# Altium integrated library Jesse_Library.IntLib: 1056 symbols (part 2 of 4) (continued)
## Ind 0804T 10uH 20% (continued)

## Ind 0805 1uH 10%
designator L?, comment 1uH ±10%
贴片电感; ComponentLink1Description: 供应商链接; ComponentLink1URL: http://www.szlcsc.com/product/details_1394.html; Package: 0805; Supplier: LC; SuppliersPartNumber: C1042
footprint 0805_L
pins: 1, 2

## Ind 0805 2.2uH 10%
designator L?, comment 2.2uH ±10%
贴片电感; ComponentLink1Description: 供应商链接; ComponentLink1URL: http://www.szlcsc.com/product/details_1395.html; Package: 0805; Supplier: LC; SuppliersPartNumber: C1043
footprint 0805_L
pins: 1, 2

## Ind 0805 3.3uH10%
designator L?, comment 3.3uH±10%
贴片电感; ComponentLink1Description: 供应商链接; ComponentLink1URL: http://www.szlcsc.com/product/details_52738.html; Package: 0805; Supplier: LC; SuppliersPartNumber: C51725
footprint 0805_L
pins: 1, 2

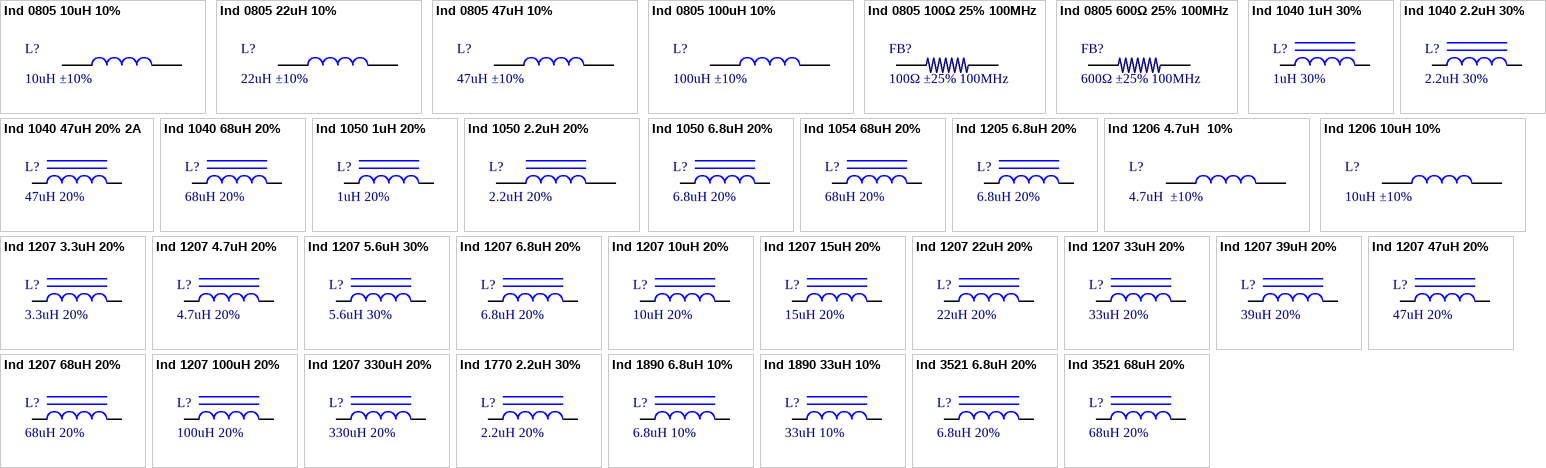
[diagram p20: symbols Ind 0805 10uH 10% to Ind 3521 68uH 20%]

## Ind 0805 10uH 10%
designator L?, comment 10uH ±10%
贴片电感; ComponentLink1Description: 供应商链接; ComponentLink1URL: http://www.szlcsc.com/product/details_1398.html; Package: 0805; Supplier: LC; SuppliersPartNumber: C1046
footprint 0805_L
pins: 1, 2

## Ind 0805 22uH 10%
designator L?, comment 22uH ±10%
贴片电感; ComponentLink1Description: 供应商链接; ComponentLink1URL: http://www.szlcsc.com/product/details_33340.html; Package: 0805; Supplier: LC; SuppliersPartNumber: C32375
footprint 0805_L
pins: 1, 2

## Ind 0805 47uH 10%
designator L?, comment 47uH ±10%
贴片电感; ComponentLink1Description: 供应商链接; ComponentLink1URL: http://www.szlcsc.com/product/details_14964.html; Package: 0805; Supplier: LC; SuppliersPartNumber: C14304
footprint 0805_L
pins: 1, 2

## Ind 0805 100uH 10%
designator L?, comment 100uH ±10%
贴片电感; ComponentLink1Description: 供应商链接; ComponentLink1URL: http://www.szlcsc.com/product/details_69137.html; Package: 0805; Supplier: LC; SuppliersPartNumber: C68035
footprint 0805_L
pins: 1, 2

## Ind 0805 100Ω 25% 100MHz
designator FB?, comment 100Ω ±25% 100MHz
贴片磁珠; ComponentLink1Description: 供应商链接; ComponentLink1URL: http://www.szlcsc.com/product/details_1367.html; Package: 0805; Supplier: LC; SuppliersPartNumber: C1015
footprint 0805_L
pins: 1, 2

## Ind 0805 600Ω 25% 100MHz
designator FB?, comment 600Ω ±25% 100MHz
贴片磁珠; ComponentLink1Description: 供应商链接; ComponentLink1URL: http://www.szlcsc.com/product/details_1369.html; Package: 0805; Supplier: LC; SuppliersPartNumber: C1017
footprint 0805_L
pins: 1, 2

## Ind 1040 1uH 30%
designator L?, comment 1uH 30%
贴片功率电感
footprint 1040_L
pins: 1, 2

## Ind 1040 2.2uH 30%
designator L?, comment 2.2uH 30%
贴片功率电感
footprint 1040_L
pins: 1, 2

## Ind 1040 47uH 20% 2A
designator L?, comment 47uH 20%
贴片功率电感
footprint 1040_L
pins: 1, 2

## Ind 1040 68uH 20%
designator L?, comment 68uH 20%
贴片功率电感
footprint 1040_L
pins: 1, 2

## Ind 1050 1uH 20%
designator L?, comment 1uH 20%
贴片功率电感
footprint 1050_L
pins: 1, 2

## Ind 1050 2.2uH 20%
designator L?, comment 2.2uH 20%
贴片功率电感
footprint 1050_L
pins: 1, 2

## Ind 1050 6.8uH 20%
designator L?, comment 6.8uH 20%
贴片功率电感
footprint 1050_L
pins: 1, 2

## Ind 1054 68uH 20%
designator L?, comment 68uH 20%
贴片功率电感
footprint 1054_L
pins: 1, 2

## Ind 1205 6.8uH 20%
designator L?, comment 6.8uH 20%
贴片功率电感
footprint 1205_L
pins: 1, 2

## Ind 1206 4.7uH  10%
designator L?, comment 4.7uH  ±10%
贴片电感; ComponentLink1Description: 供应商链接; ComponentLink1URL: http://www.szlcsc.com/product/details_1401.html; Package: 1206; Supplier: LC; SuppliersPartNumber: C1049
footprint 1206_L
pins: 1, 2

## Ind 1206 10uH 10%
designator L?, comment 10uH ±10%
贴片电感; ComponentLink1Description: 供应商链接; ComponentLink1URL: http://www.szlcsc.com/product/details_1403.html; Package: 1206; Supplier: LC; SuppliersPartNumber: C1051
footprint 1206_L
pins: 1, 2

## Ind 1207 3.3uH 20%
designator L?, comment 3.3uH 20%
贴片功率电感
footprint 1207_L
pins: 1, 2

## Ind 1207 4.7uH 20%
designator L?, comment 4.7uH 20%
贴片功率电感
footprint 1207_L
pins: 1, 2

## Ind 1207 5.6uH 30%
designator L?, comment 5.6uH 30%
贴片功率电感
footprint 1207_L
pins: 1, 2

## Ind 1207 6.8uH 20%
designator L?, comment 6.8uH 20%
贴片功率电感
footprint 1207_L
pins: 1, 2

## Ind 1207 10uH 20%
designator L?, comment 10uH 20%
贴片功率电感
footprint 1207_L
pins: 1, 2

## Ind 1207 15uH 20%
designator L?, comment 15uH 20%
贴片功率电感
footprint 1207_L
pins: 1, 2

## Ind 1207 22uH 20%
designator L?, comment 22uH 20%
贴片功率电感
footprint 1207_L
pins: 1, 2

## Ind 1207 33uH 20%
designator L?, comment 33uH 20%
贴片功率电感
footprint 1207_L
pins: 1, 2

## Ind 1207 39uH 20%
designator L?, comment 39uH 20%
贴片功率电感
footprint 1207_L
pins: 1, 2

## Ind 1207 47uH 20%
designator L?, comment 47uH 20%
贴片功率电感
footprint 1207_L
pins: 1, 2

## Ind 1207 68uH 20%
designator L?, comment 68uH 20%
贴片功率电感
footprint 1207_L
pins: 1, 2

## Ind 1207 100uH 20%
designator L?, comment 100uH 20%
贴片功率电感
footprint 1207_L
pins: 1, 2

## Ind 1207 330uH 20%
designator L?, comment 330uH 20%
贴片功率电感
footprint 1207_L
pins: 1, 2

## Ind 1770 2.2uH 30%
designator L?, comment 2.2uH 20%
贴片功率电感
footprint 1770_L
pins: 1, 2

## Ind 1890 6.8uH 10%
designator L?, comment 6.8uH 10%
贴片功率电感
footprint 1890_L (18X18)
pins: 1, 2

## Ind 1890 33uH 10%
designator L?, comment 33uH 10%
贴片功率电感
footprint 1890_L (18X18)
pins: 1, 2

## Ind 3521 6.8uH 20%
designator L?, comment 6.8uH 20%
贴片功率电感
footprint 3521_L
pins: 1, 2

## Ind 3521 68uH 20%
designator L?, comment 68uH 20%
贴片功率电感
footprint 3521_L
pins: 1, 2


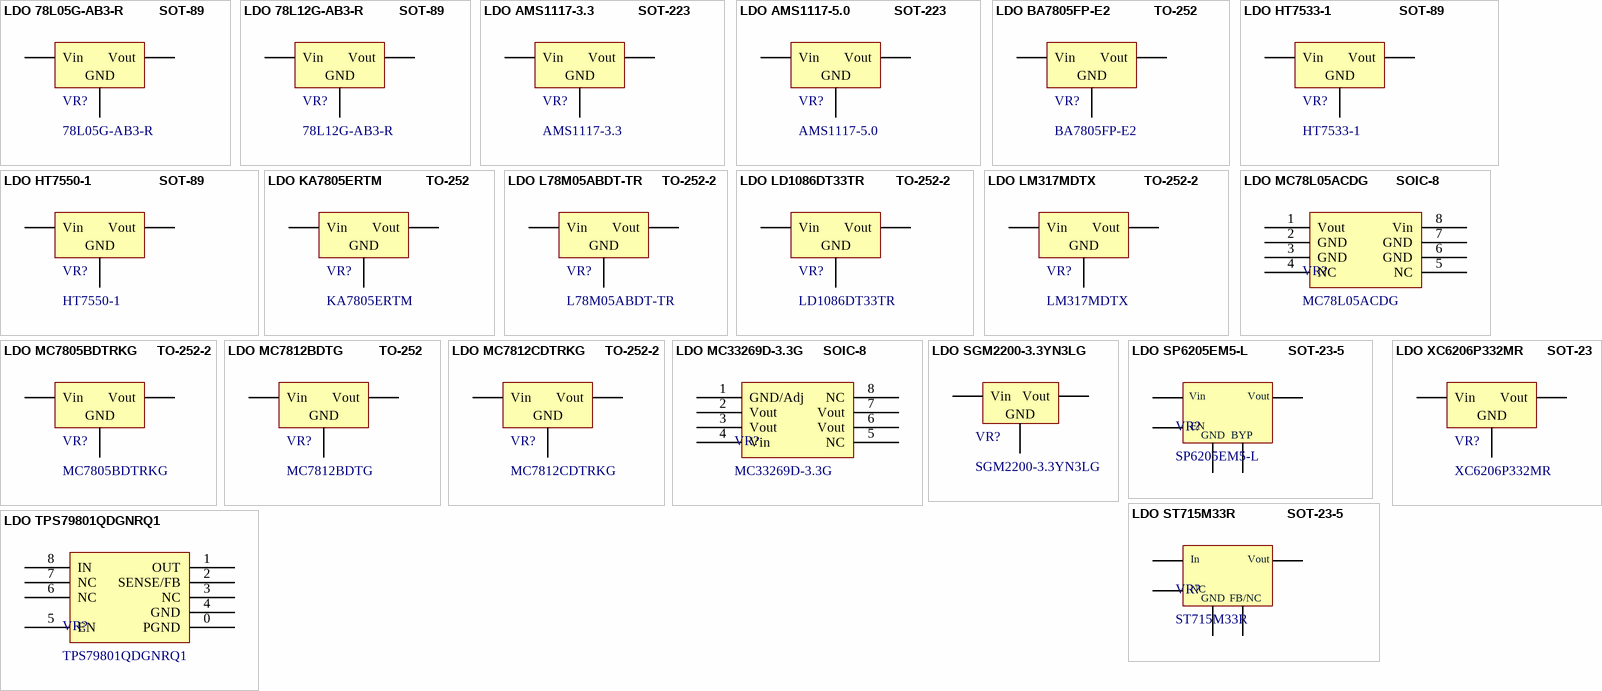
[diagram p21: symbols LDO 78L05G-AB3-R         SOT-89 to LDO XC6206P332MR      SOT-23]

## LDO 78L05G-AB3-R         SOT-89
designator VR?, comment 78L05G-AB3-R
低压差线性稳压(LDO); Package: SOT-89; Supplier: LC; SuppliersPartNumber: C71136; ComponentLink1Description: 立创商城链接; ComponentLink1URL: https://item.szlcsc.com/72235.html
footprint SOT89-3
pins: 1 Vout, 2 GND, 3 Vin

## LDO 78L12G-AB3-R         SOT-89
designator VR?, comment 78L12G-AB3-R
低压差线性稳压(LDO); Package: SOT-89; Supplier: LC; SuppliersPartNumber: C75501; ComponentLink1Description: 立创商城链接; ComponentLink1URL: https://item.szlcsc.com/76626.html
footprint SOT89-3
pins: 1 Vout, 2 GND, 3 Vin

## LDO AMS1117-3.3           SOT-223
designator VR?, comment AMS1117-3.3
低压差线性稳压(LDO); Package: SOT-223; Supplier: LC; SuppliersPartNumber: C6186; ComponentLink1Description: 立创商城链接; ComponentLink1URL: https://item.szlcsc.com/6652.html
footprint SOT223
pins: 1 GND, 2 Vout, 3 Vin

## LDO AMS1117-5.0           SOT-223
designator VR?, comment AMS1117-5.0
低压差线性稳压(LDO); Package: SOT-223; Supplier: LC; SuppliersPartNumber: C6187; ComponentLink1Description: 立创商城链接; ComponentLink1URL: https://item.szlcsc.com/6653.html
footprint SOT223
pins: 1 GND, 2 Vout, 3 Vin

## LDO BA7805FP-E2           TO-252
designator VR?, comment BA7805FP-E2
低压差线性稳压(LDO); Package: SOT-89; Supplier: LC; SuppliersPartNumber: C71136; ComponentLink1Description: 立创商城链接; ComponentLink1URL: https://item.szlcsc.com/80782.html
footprint TO252 (252晶体管)
pins: 1 Vin, 2 GND, 3 Vout

## LDO HT7533-1                 SOT-89
designator VR?, comment HT7533-1
低压差线性稳压(LDO); Package: SOT-89; Supplier: LC; SuppliersPartNumber: C14289; ComponentLink1Description: 立创商城链接; ComponentLink1URL: https://item.szlcsc.com/14949.html
footprint SOT89-3
pins: 1 GND, 2 Vin, 3 Vout

## LDO HT7550-1                 SOT-89
designator VR?, comment HT7550-1
低压差线性稳压(LDO); Package: SOT-89; Supplier: LC; SuppliersPartNumber: C16106; ComponentLink1Description: 立创商城链接; ComponentLink1URL: https://item.szlcsc.com/16788.html
footprint SOT89-3
pins: 1 GND, 2 Vin, 3 Vout

## LDO KA7805ERTM           TO-252
designator VR?, comment KA7805ERTM
低压差线性稳压(LDO); Package: SOT-89; Supplier: LC; SuppliersPartNumber: C71136; ComponentLink1Description: 立创商城链接; ComponentLink1URL: https://item.szlcsc.com/250123.html
footprint TO252 (252晶体管)
pins: 1 Vin, 2 GND, 3 Vout

## LDO L78M05ABDT-TR     TO-252-2
designator VR?, comment L78M05ABDT-TR
低压差线性稳压(LDO); Package: TO-252-2; Supplier: LC; SuppliersPartNumber: C58069; ComponentLink1Description: 立创商城链接; ComponentLink1URL: https://item.szlcsc.com/59107.html
footprint TO252 (252晶体管)
pins: 1 Vin, 2 GND, 3 Vout

## LDO LD1086DT33TR        TO-252-2
designator VR?, comment LD1086DT33TR
低压差线性稳压(LDO); Package: TO-252-2; Supplier: LC; SuppliersPartNumber: C75510; ComponentLink1Description: 立创商城链接; ComponentLink1URL: https://item.szlcsc.com/12615.html
footprint TO252 (252晶体管)
pins: 1 GND, 2 Vout, 3 Vin

## LDO LM317MDTX            TO-252-2
designator VR?, comment LM317MDTX
低压差线性稳压(LDO); Package: TO-252-2; Supplier: LC; SuppliersPartNumber: C75510; ComponentLink1Description: 立创商城链接; ComponentLink1URL: https://item.szlcsc.com/232561.html
footprint TO252 (252晶体管)
pins: 1 GND, 2 Vout, 3 Vin

## LDO MC78L05ACDG       SOIC-8
designator VR?, comment MC78L05ACDG
低压差线性稳压器(LDO); ComponentLink1Description: 立创商城链接; ComponentLink1URL: https://item.szlcsc.com/232528.html
footprint SOIC8_150mil
pins: 1 Vout, 2 GND, 3 GND, 4 NC, 5 NC, 6 GND, 7 GND, 8 Vin

## LDO MC7805BDTRKG     TO-252-2
designator VR?, comment MC7805BDTRKG
低压差线性稳压(LDO); Package: TO-252-2; Supplier: LC; SuppliersPartNumber: C58069; ComponentLink1Description: 立创商城链接; ComponentLink1URL: https://item.szlcsc.com/112133.html
footprint TO252 (252晶体管)
pins: 1 Vin, 2 GND, 3 Vout

## LDO MC7812BDTG         TO-252
designator VR?, comment MC7812BDTG
低压差线性稳压(LDO); Package: TO-252-2; Supplier: LC; SuppliersPartNumber: C58069; ComponentLink1Description: 立创商城链接; ComponentLink1URL: https://item.szlcsc.com/233103.html
footprint TO252 (252晶体管)
pins: 1 Vin, 2 GND, 3 Vout

## LDO MC7812CDTRKG     TO-252-2
designator VR?, comment MC7812CDTRKG
低压差线性稳压(LDO); Package: TO-252-2; Supplier: LC; SuppliersPartNumber: C58069; ComponentLink1Description: 立创商城链接; ComponentLink1URL: https://item.szlcsc.com/114773.html
footprint TO252 (252晶体管)
pins: 1 Vin, 2 GND, 3 Vout

## LDO MC33269D-3.3G     SOIC-8
designator VR?, comment MC33269D-3.3G
低压差线性稳压器(LDO); ComponentLink1Description: 立创商城链接; ComponentLink1URL: https://item.szlcsc.com/232276.html
footprint SOIC8_150mil
pins: 1 GND/Adj, 2 Vout, 3 Vout, 4 Vin, 5 NC, 6 Vout, 7 Vout, 8 NC

## LDO SGM2200-3.3YN3LG
designator VR?, comment SGM2200-3.3YN3LG
低压差线性稳压(LDO); Package: SOT-23; Supplier: LC; SuppliersPartNumber: C5446; ComponentLink1Description: 立创商城链接; ComponentLink1URL: https://item.szlcsc.com/82078.html
footprint SOT23-3
pins: 1 GND, 2 Vout, 3 Vin

## LDO SP6205EM5-L          SOT-23-5
designator VR?, comment SP6205EM5-L
低压差线性稳压器(LDO); ComponentLink1Description: 立创商城链接; ComponentLink1URL: https://item.szlcsc.com/82723.html
footprint SOT23-5
pins: 1 Vin, 2  GND, 3 EN, 4 BYP, 5 Vout

## LDO ST715M33R             SOT-23-5
designator VR?, comment ST715M33R
低压差线性稳压器(LDO); ComponentLink1Description: 立创商城链接; ComponentLink1URL: https://item.szlcsc.com/110132.html
footprint SOT23-5
pins: 1 FB/NC, 2  GND, 3 NC, 4 IN, 5 Vout
text: In

## LDO TPS79801QDGNRQ1
designator VR?, comment TPS79801QDGNRQ1
低压差线性稳压器(LDO); ComponentLink1Description: 立创商城链接; ComponentLink1URL: https://item.szlcsc.com/140631.html
footprint TSSOP8 3X3_150Mil
pins: 0 PGND, 1 OUT, 2 SENSE/FB, 3 NC, 4 GND, 5 EN, 6 NC, 7 NC, 8 IN

## LDO XC6206P332MR      SOT-23
designator VR?, comment XC6206P332MR
低压差线性稳压(LDO); Package: SOT-23; Supplier: LC; SuppliersPartNumber: C5446; ComponentLink1Description: 立创商城链接; ComponentLink1URL: https://item.szlcsc.com/324036.html
footprint SOT23-3L (http://www.aosmd.com/res/packaging_information/SOT-23-3L.pdf)
pins: 1 GND, 2 Vout, 3 Vin


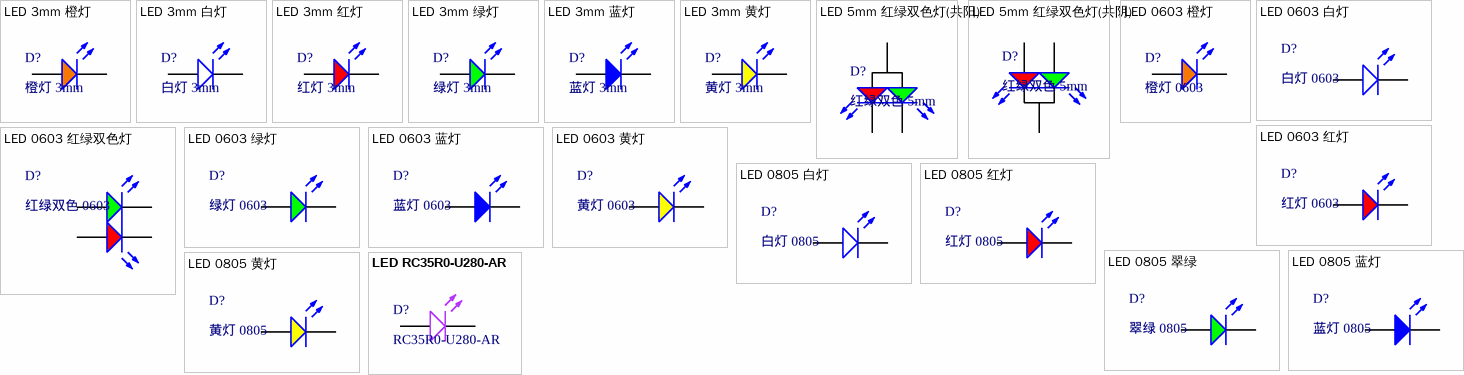
[diagram p22: symbols LED 3mm 橙灯 to LED RC35R0-U280-AR]

## LED 3mm 橙灯
designator D?, comment 橙灯 3mm
3mm直插发光二极管
footprint LED3-YEL
pins: A, K

## LED 3mm 白灯
designator D?, comment 白灯 3mm
3mm直插发光二极管
footprint LED 3mm
pins: A, K

## LED 3mm 红灯
designator D?, comment 红灯 3mm
3mm直插发光二极管
footprint LED3-RED
pins: A, K

## LED 3mm 绿灯
designator D?, comment 绿灯 3mm
3mm直插发光二极管
footprint LED3-GRE
pins: A, K

## LED 3mm 蓝灯
designator D?, comment 蓝灯 3mm
3mm直插发光二极管
footprint LED3-BLUE
pins: A, K

## LED 3mm 黄灯
designator D?, comment 黄灯 3mm
3mm直插发光二极管
footprint LED3-YEL
pins: A, K

## LED 5mm 红绿双色灯(共阳)
designator D?, comment 红绿双色 5mm
直插发光二极管; ComponentLink1Description: 供应商链接; ComponentLink1URL: http://www.szlcsc.com/product/details_73152.html; Package: 0603; Supplier: LC; SuppliersPartNumber: C72043
footprint RED&GREEN_LED
pins: 1, 2, 3

## LED 5mm 红绿双色灯(共阴)
designator D?, comment 红绿双色 5mm
直插发光二极管; Package: 0603; Supplier: LC; SuppliersPartNumber: C72043
footprint RED&GREEN_LED
pins: 1, 2, 3

## LED 0603 橙灯
designator D?, comment 橙灯 0603
贴片发光二极管
footprint LED 0603ORANGE
pins: A, K

## LED 0603 白灯
designator D?, comment 白灯 0603
贴片发光二极管; ComponentLink1Description: 供应商链接; ComponentLink1URL: http://www.szlcsc.com/product/details_2663.html; Package: 0603; Supplier: LC; SuppliersPartNumber: C2290
footprint LED 0603WHITE
pins: A, K

## LED 0603 红灯
designator D?, comment 红灯 0603
贴片发光二极管; ComponentLink1Description: 供应商链接; ComponentLink1URL: http://www.szlcsc.com/product/details_2659.html; Package: 0603; Supplier: LC; SuppliersPartNumber: C2286
footprint LED 0603RED
pins: A, K

## LED 0603 红绿双色灯
designator D?, comment 红绿双色 0603
贴片发光二极管; ComponentLink1Description: 供应商链接; ComponentLink1URL: http://www.szlcsc.com/product/details_73152.html; Package: 0603; Supplier: LC; SuppliersPartNumber: C72043
footprint LED 0603RED&GRE
pins: 1, 2, 3, 4

## LED 0603 绿灯
designator D?, comment 绿灯 0603
贴片发光二极管; ComponentLink1Description: 供应商链接; ComponentLink1URL: http://www.szlcsc.com/product/details_73152.html; Package: 0603; Supplier: LC; SuppliersPartNumber: C72043
footprint LED 0603GREEN
pins: A, K

## LED 0603 蓝灯
designator D?, comment 蓝灯 0603
贴片发光二极管; ComponentLink1Description: 供应商链接; ComponentLink1URL: http://www.szlcsc.com/product/details_73150.html; Package: 0603; Supplier: LC; SuppliersPartNumber: C72041
footprint LED 0603GREEN
pins: A, K

## LED 0603 黄灯
designator D?, comment 黄灯 0603
贴片发光二极管; ComponentLink1Description: 供应商链接; ComponentLink1URL: http://www.szlcsc.com/product/details_73147.html; Package: 0603; Supplier: LC; SuppliersPartNumber: C72038
footprint LED 0603YELLOW
pins: A, K

## LED 0805 白灯
designator D?, comment 白灯 0805
贴片发光二极管; ComponentLink1Description: 供应商链接; ComponentLink1URL: http://www.szlcsc.com/product/details_35468.html; Package: 0805; Supplier: LC; SuppliersPartNumber: C34499
footprint LED 0805WHITE (1/8W)
pins: A, K

## LED 0805 红灯
designator D?, comment 红灯 0805
贴片发光二极管; ComponentLink1Description: 供应商链接; ComponentLink1URL: http://www.szlcsc.com/product/details_2668.html; Package: 0805; Supplier: LC; SuppliersPartNumber: C2295
footprint LED 0805RED
pins: A, K

## LED 0805 翠绿
designator D?, comment 翠绿 0805
贴片发光二极管; ComponentLink1Description: 供应商链接; ComponentLink1URL: http://www.szlcsc.com/product/details_2670.html; Package: 0805; Supplier: LC; SuppliersPartNumber: C2297
footprint LED 0805GREEN
pins: A, K

## LED 0805 蓝灯
designator D?, comment 蓝灯 0805
贴片发光二极管; ComponentLink1Description: 供应商链接; ComponentLink1URL: http://www.szlcsc.com/product/details_2666.html; Package: 0805; Supplier: LC; SuppliersPartNumber: C2293
footprint LED 0805GREEN
pins: A, K

## LED 0805 黄灯
designator D?, comment 黄灯 0805
贴片发光二极管; ComponentLink1Description: 供应商链接; ComponentLink1URL: http://www.szlcsc.com/product/details_2669.html; Package: 0805; Supplier: LC; SuppliersPartNumber: C2296
footprint LED 0805YELLOW
pins: A, K

## LED RC35R0-U280-AR
designator D?, comment RC35R0-U280-AR
紫外贴片发光二极管
footprint 3535
pins: A, K


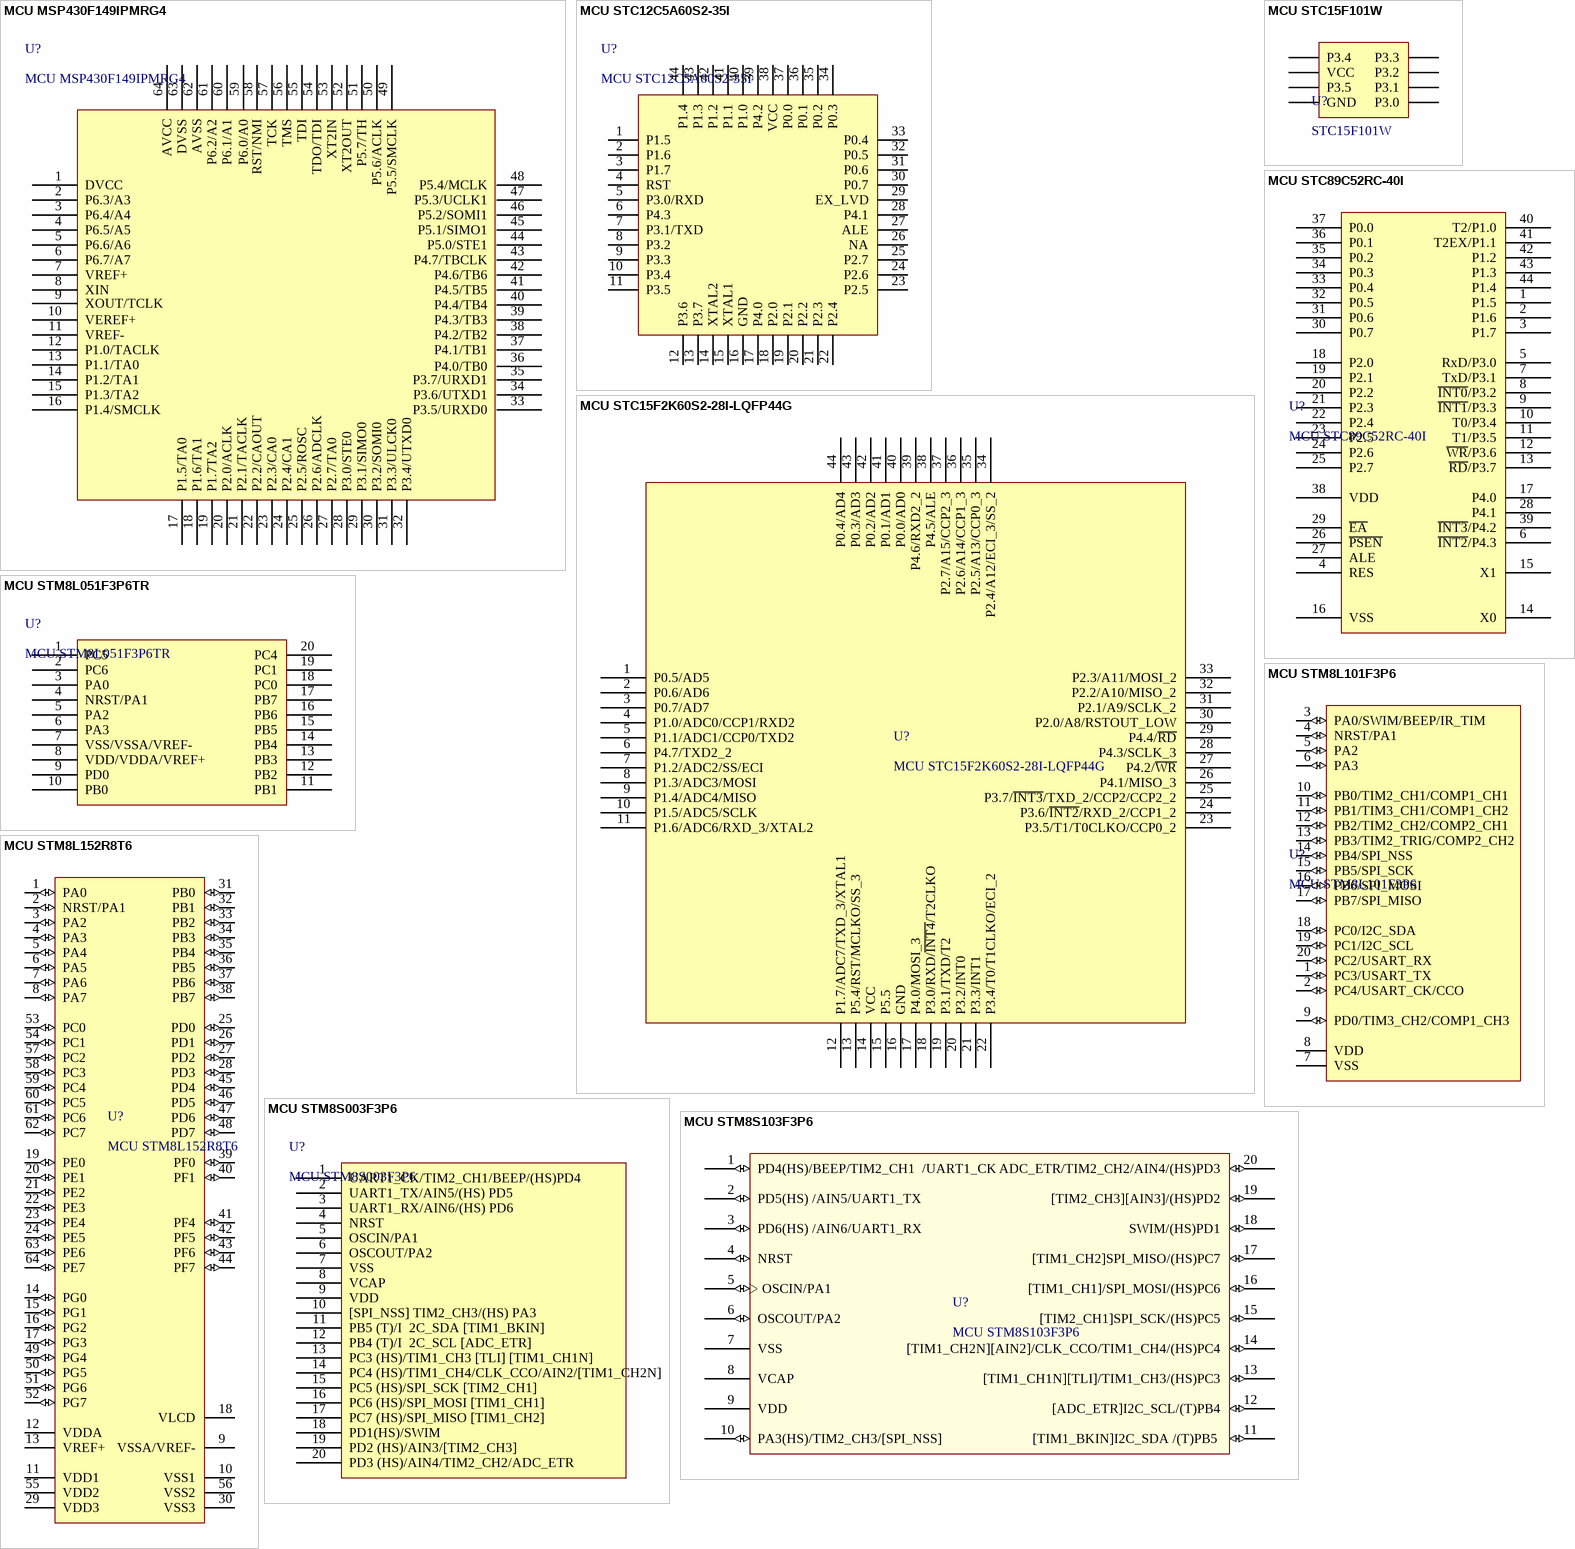
[diagram p23: symbols MCU MSP430F149IPMRG4 to MCU STM8S103F3P6]

## MCU MSP430F149IPMRG4
designator U?
MCU; ComponentLink1Description: 供应商链接; ComponentLink1URL: http://www.szlcsc.com/product/details_8068.html; Package: LQFP-64_10x10x05P; Supplier: LC; SuppliersPartNumber: C7591
footprint LQFP64 10x10
pins: 1 DVCC, 2 P6.3/A3, 3 P6.4/A4, 4 P6.5/A5, 5 P6.6/A6, 6 P6.7/A7, 7 VREF+, 8 XIN, 9 XOUT/TCLK, 10 VEREF+, 11 VREF-, 12 P1.0/TACLK, 13 P1.1/TA0, 14 P1.2/TA1, 15 P1.3/TA2, 16 P1.4/SMCLK, 17 P1.5/TA0, 18 P1.6/TA1, 19 P1.7TA2, 20 P2.0/ACLK, 21 P2.1/TACLK, 22 P2.2/CAOUT, 23 P2.3/CA0, 24 P2.4/CA1, 25 P2.5/ROSC, 26 P2.6/ADCLK, 27 P2.7/TA0, 28 P3.0/STE0, 29 P3.1/SIMO0, 30 P3.2/SOMI0, 31 P3.3/ULCK0, 32 P3.4/UTXD0, 33 P3.5/URXD0, 34 P3.6/UTXD1, 35 P3.7/URXD1, 36 P4.0/TB0, 37 P4.1/TB1, 38 P4.2/TB2, 39 P4.3/TB3, 40 P4.4/TB4, 41 P4.5/TB5, 42 P4.6/TB6, 43 P4.7/TBCLK, 44 P5.0/STE1, 45 P5.1/SIMO1, 46 P5.2/SOMI1, 47 P5.3/UCLK1, 48 P5.4/MCLK, 49 P5.5/SMCLK, 50 P5.6/ACLK, 51 P5.7/TH, 52 XT2OUT, 53 XT2IN, 54 TDO/TDI, 55 TDI, 56 TMS, 57 TCK, 58 RST/NMI, 59 P6.0/A0, 60 P6.1/A1, 61 P6.2/A2, 62 AVSS, 63 DVSS, 64 AVCC

## MCU STC12C5A60S2-35I
designator U?
MCU; ComponentLink1Description: 供应商链接; ComponentLink1URL: http://www.szlcsc.com/product/details_9202.html; Package: LQFP-44_10x10x08P; Supplier: LC; SuppliersPartNumber: C8696
footprint LQFP44 10X10
pins: 1 P1.5, 2 P1.6, 3 P1.7, 4 RST, 5 P3.0/RXD, 6 P4.3, 7 P3.1/TXD, 8 P3.2, 9 P3.3, 10 P3.4, 11 P3.5, 12 P3.6, 13 P3.7, 14 XTAL2, 15 XTAL1, 16 GND (power), 17 P4.0, 18 P2.0, 19 P2.1, 20 P2.2, 21 P2.3, 22 P2.4, 23 P2.5, 24 P2.6, 25 P2.7, 26 NA, 27 ALE, 28 P4.1, 29 EX_LVD, 30 P0.7, 31 P0.6, 32 P0.5, 33 P0.4, 34 P0.3, 35 P0.2, 36 P0.1, 37 P0.0, 38 VCC (power), 39 P4.2, 40 P1.0, 41 P1.1, 42 P1.2, 43 P1.3, 44 P1.4

## MCU STC15F2K60S2-28I-LQFP44G
designator U?
MCU; ComponentLink1Description: 供应商链接; ComponentLink1URL: http://www.szlcsc.com/product/details_30740.html; Package: LQFP-44_10x10x08P; Supplier: LC; SuppliersPartNumber: C29985
footprint LQFP44 10X10
pins: 1 P0.5/AD5, 2 P0.6/AD6, 3 P0.7/AD7, 4 P1.0/ADC0/CCP1/RXD2, 5 P1.1/ADC1/CCP0/TXD2, 6 P4.7/TXD2_2, 7 P1.2/ADC2/SS/ECI, 8 P1.3/ADC3/MOSI, 9 P1.4/ADC4/MISO, 10 P1.5/ADC5/SCLK, 11 P1.6/ADC6/RXD_3/XTAL2, 12 P1.7/ADC7/TXD_3/XTAL1, 13 P5.4/RST/MCLKO/SS_3, 14 VCC, 15 P5.5, 16 GND, 17 P4.0/MOSI_3, 18 P3.0/RXD/~{INT4}/T2CLKO, 19 P3.1/TXD/T2, 20 P3.2/INT0, 21 P3.3/INT1, 22 P3.4/T0/T1CLKO/ECI_2, 23 P3.5/T1/T0CLKO/CCP0_2, 24 P3.6/~{INT2}/RXD_2/CCP1_2, 25 P3.7/~{INT3}/TXD_2/CCP2/CCP2_2, 26 P4.1/MISO_3, 27 P4.2/~{WR}, 28 P4.3/SCLK_3, 29 P4.4/~{RD}, 30 P2.0/A8/RSTOUT_LOW, 31 P2.1/A9/SCLK_2, 32 P2.2/A10/MISO_2, 33 P2.3/A11/MOSI_2, 34 P2.4/A12/ECI_3/SS_2, 35 P2.5/A13/CCP0_3, 36 P2.6/A14/CCP1_3, 37 P2.7/A15/CCP2_3, 38 P4.5/ALE, 39 P4.6/RXD2_2, 40 P0.0/AD0, 41 P0.1/AD1, 42 P0.2/AD2, 43 P0.3/AD3, 44 P0.4/AD4

## MCU STC15F101W
designator U?, comment STC15F101W
MCU
footprint SOP8_150MIL
pins: 1 P3.4, 2 VCC, 3 P3.5, 4 GND, 5 P3.0, 6 P3.1, 7 P3.2, 8 P3.3

## MCU STC89C52RC-40I
designator U?
MCU; ComponentLink1Description: 供应商链接; ComponentLink1URL: http://www.szlcsc.com/product/details_9213.html; Package: LQFP-44_10x10x08P; Supplier: LC; SuppliersPartNumber: C8707
footprint LQFP44 10X10
pins: 1 P1.5, 2 P1.6, 3 P1.7, 4 RES, 5 RxD/P3.0, 6 ~{INT2}/P4.3, 7 TxD/P3.1, 8 ~{INT0}/P3.2, 9 ~{INT1}/P3.3, 10 T0/P3.4, 11 T1/P3.5, 12 ~{WR}/P3.6, 13 ~{RD}/P3.7, 14 X0, 15 X1, 16 VSS, 17 P4.0, 18 P2.0, 19 P2.1, 20 P2.2, 21 P2.3, 22 P2.4, 23 P2.5, 24 P2.6, 25 P2.7, 26 ~{PSEN}, 27 ALE, 28 P4.1, 29 ~{EA}, 30 P0.7, 31 P0.6, 32 P0.5, 33 P0.4, 34 P0.3, 35 P0.2, 36 P0.1, 37 P0.0, 38 VDD, 39 ~{INT3}/P4.2, 40 T2/P1.0, 41 T2EX/P1.1, 42 P1.2, 43 P1.3, 44 P1.4

## MCU STM8L051F3P6TR
designator U?
MCU; ComponentLink1Description: 供应商链接; ComponentLink1URL: http://www.szlcsc.com/product/details_18776.html; Package: TSSOP-20; Supplier: LC; SuppliersPartNumber: C18088
footprint TSSOP20
pins: 1 PC5, 2 PC6, 3 PA0, 4 NRST/PA1, 5 PA2, 6 PA3, 7 VSS/VSSA/VREF-, 8 VDD/VDDA/VREF+, 9 PD0, 10 PB0, 11 PB1, 12 PB2, 13 PB3, 14 PB4, 15 PB5, 16 PB6, 17 PB7, 18 PC0, 19 PC1, 20 PC4

## MCU STM8L101F3P6
designator U?
MCU; ComponentLink1Description: 供应商链接; ComponentLink1URL: http://www.szlcsc.com/product/details_30799.html; Package: TSSOP-20; Supplier: LC; SuppliersPartNumber: C30044
footprint TSSOP20
pins: 1 PC3/USART_TX (io), 2 PC4/USART_CK/CCO (io), 3 PA0/SWIM/BEEP/IR_TIM (io), 4 NRST/PA1 (io), 5 PA2 (io), 6 PA3 (io), 7 VSS (power), 8 VDD (power), 9 PD0/TIM3_CH2/COMP1_CH3 (io), 10 PB0/TIM2_CH1/COMP1_CH1 (io), 11 PB1/TIM3_CH1/COMP1_CH2 (io), 12 PB2/TIM2_CH2/COMP2_CH1 (io), 13 PB3/TIM2_TRIG/COMP2_CH2 (io), 14 PB4/SPI_NSS (io), 15 PB5/SPI_SCK (io), 16 PB6/SPI_MOSI (io), 17 PB7/SPI_MISO (io), 18 PC0/I2C_SDA (io), 19 PC1/I2C_SCL (io), 20 PC2/USART_RX (io)